# Altium footprint library hand_ad_lib.PcbLib: 105 footprints (part 5 of 7)
Each footprint in its own frame and in the unit in brackets; x right, y up, seen from the top. Pads: shape width x height; smd on the part's side, far side on the other; paste and mask are expansions set on the pad; w line width, h text height; cw(c..) or ccw(c..) is an arc to the next point about the centre after c.
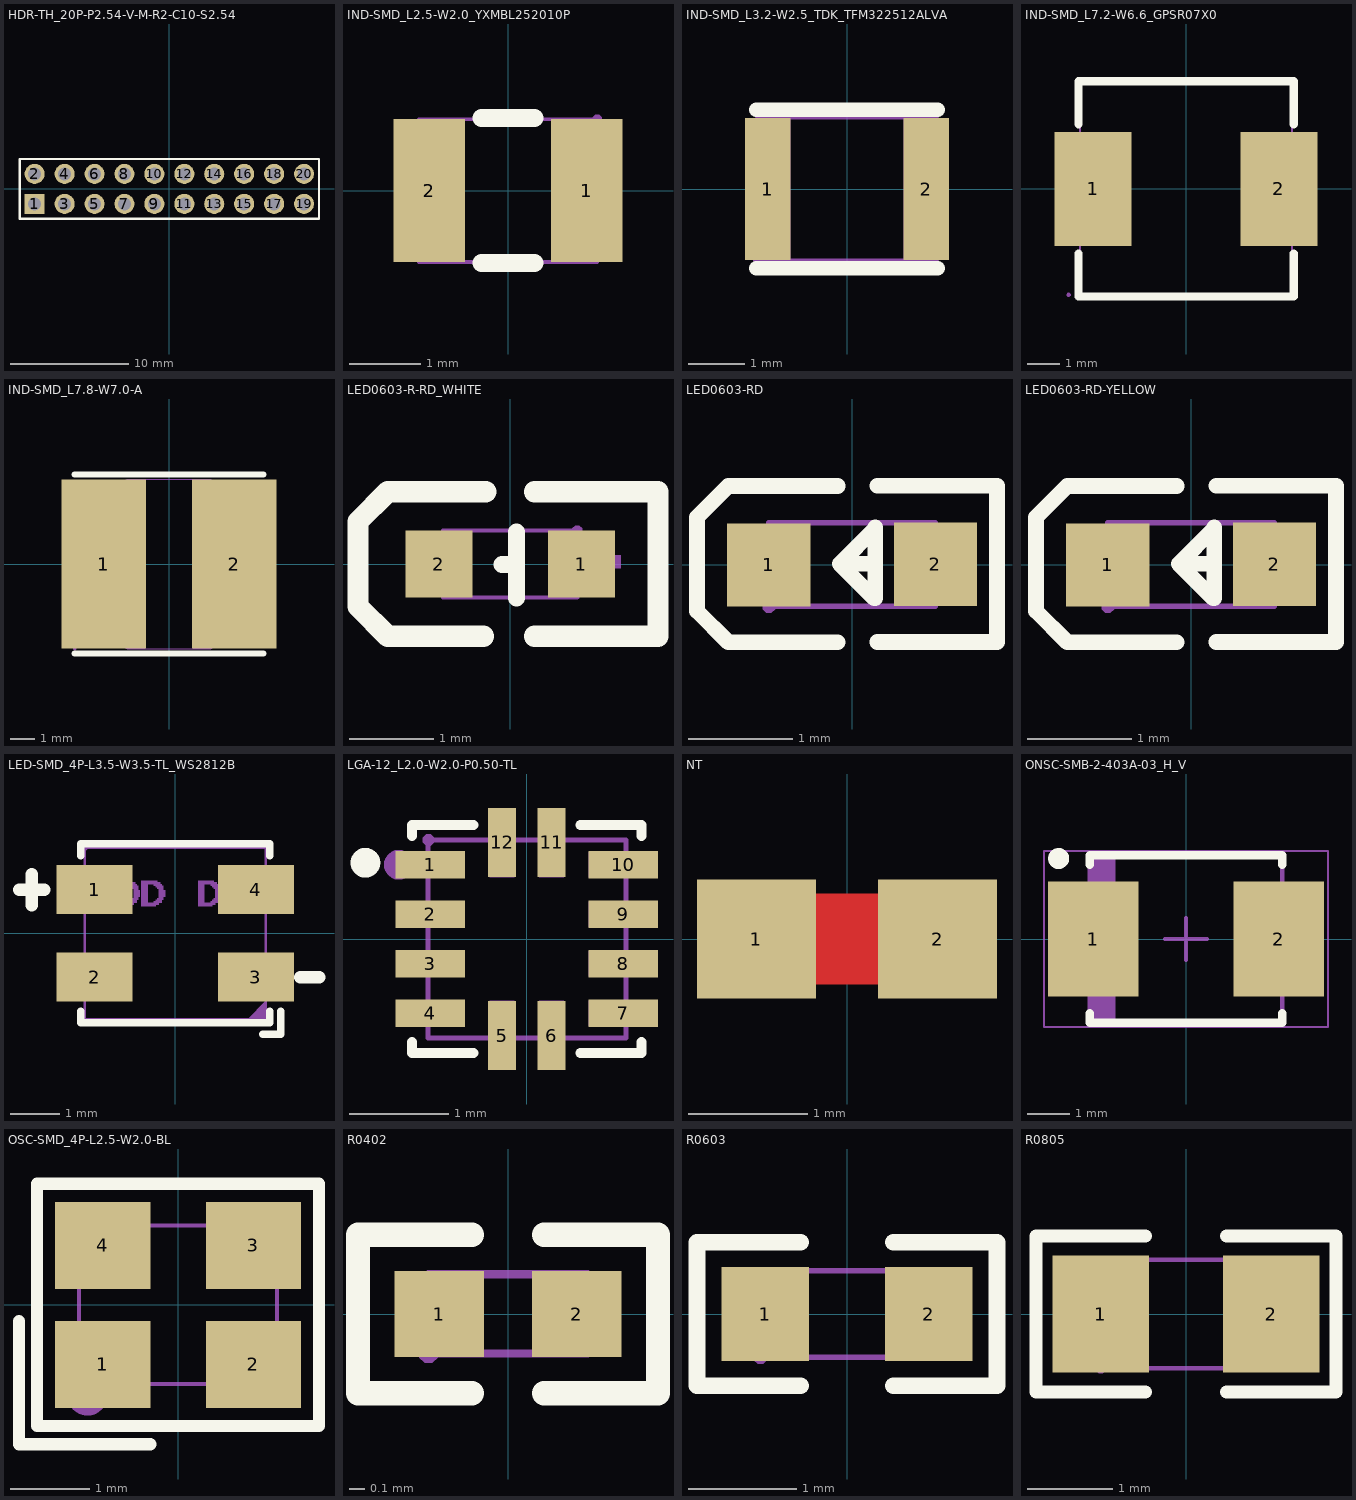
[diagram p4: the footprints below, top view; thin cyan lines are the x and y axes]

## HDR-TH_20P-P2.54-V-M-R2-C10-S2.54 [mm]
pads (20):
  rect 1.7x1.7 hole 1.1: 1(-11.43,-1.27)
  round 1.7 hole 1.1: 2(-11.43,1.27) 3(-8.89,-1.27) 4(-8.89,1.27) 5(-6.35,-1.27) 6(-6.35,1.27) 7(-3.81,-1.27) 8(-3.81,1.27) 9(-1.27,-1.27) 10(-1.27,1.27) 11(1.27,-1.27) 12(1.27,1.27) 13(3.81,-1.27) 14(3.81,1.27) 15(6.35,-1.27) 16(6.35,1.27) 17(8.89,-1.27) 18(8.89,1.27) 19(11.43,-1.27) 20(11.43,1.27)
Top Overlay:
  lines w0.203: -12.7,-2.54 -10.795,-2.54 12.7,-2.54 12.7,2.54 -10.795,2.54 -12.7,2.54 -12.7,-2.54
Mechanical 15:
  region: -12.64,-2.5 -12.64,-2.475 -12.675,-2.44 -12.725,-2.44 -12.76,-2.475 -12.76,-2.5 -12.76,-2.525 -12.725,-2.56 -12.675,-2.56 -12.64,-2.525
  region: -11.75,-0.95 -11.11,-0.95 -11.11,-1.59 -11.75,-1.59
  region: -11.75,1.59 -11.11,1.59 -11.11,0.95 -11.75,0.95
  region: -9.21,-0.95 -8.57,-0.95 -8.57,-1.59 -9.21,-1.59
  region: -9.21,1.59 -8.57,1.59 -8.57,0.95 -9.21,0.95
  region: -6.67,-0.95 -6.03,-0.95 -6.03,-1.59 -6.67,-1.59
  region: -6.67,1.59 -6.03,1.59 -6.03,0.95 -6.67,0.95
  region: -4.13,-0.95 -3.49,-0.95 -3.49,-1.59 -4.13,-1.59
  region: -4.13,1.59 -3.49,1.59 -3.49,0.95 -4.13,0.95
  region: -1.59,-0.95 -0.95,-0.95 -0.95,-1.59 -1.59,-1.59
  region: -1.59,1.59 -0.95,1.59 -0.95,0.95 -1.59,0.95
  region: 0.95,-0.95 1.59,-0.95 1.59,-1.59 0.95,-1.59
  region: 0.95,1.59 1.59,1.59 1.59,0.95 0.95,0.95
  region: 3.49,-0.95 4.13,-0.95 4.13,-1.59 3.49,-1.59
  region: 3.49,1.59 4.13,1.59 4.13,0.95 3.49,0.95
  region: 6.03,-0.95 6.67,-0.95 6.67,-1.59 6.03,-1.59
  region: 6.03,1.59 6.67,1.59 6.67,0.95 6.03,0.95
  region: 8.57,-0.95 9.21,-0.95 9.21,-1.59 8.57,-1.59
  region: 8.57,1.59 9.21,1.59 9.21,0.95 8.57,0.95
  region: 11.11,-0.95 11.75,-0.95 11.75,-1.59 11.11,-1.59
  region: 11.11,1.59 11.75,1.59 11.75,0.95 11.11,0.95
  lines w0.051: -12.7,-2.5 -12.7,2.5 12.7,2.5 12.7,-2.5 -12.7,-2.5
3D body "PH2.54-2x10.x_t": height 8.49, standoff -3.01, extent -12.7,-2.54 12.701,2.54

## IND-SMD_L2.5-W2.0_YXMBL252010P [mm]
pads (2):
  rect 1x2 smd: 1(1.1,0) 2(-1.1,0)
Top Overlay:
  lines w0.254: -0.369,-1.016 0.369,-1.016 ; -0.369,1.016 0.369,1.016
Mechanical 15:
  region: -1.25,0.9 -0.65,0.9 -0.65,-0.9 -1.25,-0.9
  region: 0.65,0.9 1.25,0.9 1.25,-0.9 0.65,-0.9
  region: 1.31,1 1.31,1.025 1.275,1.06 1.225,1.06 1.19,1.025 1.19,1 1.19,0.975 1.225,0.94 1.275,0.94 1.31,0.975
  lines w0.051: -1.25,-1 -1.25,1 1.25,1 1.25,-1 -1.25,-1
3D body "SLO252010FR47MTT.x_t": height 1.01, standoff 0, extent -1.26,-1.01 1.26,1

## IND-SMD_L3.2-W2.5_TDK_TFM322512ALVA [mm]
pads (2):
  rect 0.8x2.5 smd paste+0 mask+0.05: 1(-1.4,0) 2(1.4,0)
Top Overlay:
  lines w0.254: -1.6,-1.4 1.6,-1.4 ; -1.6,1.4 1.6,1.4
Mechanical 15:
  region: -1.54,-1.25 -1.54,-1.225 -1.575,-1.19 -1.625,-1.19 -1.66,-1.225 -1.66,-1.25 -1.66,-1.275 -1.625,-1.31 -1.575,-1.31 -1.54,-1.275
  region: 1.6,1.25 1.6,-1.25 1,-1.25 1,1.25
  region: -1,1.25 -1,-1.25 -1.6,-1.25 -1.6,1.25
  lines w0.051: -1.6,-1.25 -1.6,1.25 1.6,1.25 1.6,-1.25 -1.6,-1.25
3D body "TFM322512ALMA1R0MTAA.stp": height 1.2, standoff 0, extent -1.6,-1.25 1.6,1.25

## IND-SMD_L7.2-W6.6_GPSR07X0 [mm]
pads (2):
  rect 2.35x3.5 smd: 1(-2.85,0) 2(2.85,0)
Top Overlay:
  lines w0.254: -3.3,-1.981 -3.3,-3.3 3.3,-3.3 3.3,-1.981 ; -3.3,1.981 -3.3,3.3 3.3,3.3 3.3,1.981
Mechanical 15:
  region: -1.9,-1.5 -3.6,-1.5 -3.6,1.5 -1.9,1.5
  region: 1.9,1.5 3.6,1.5 3.6,-1.5 1.9,-1.5
  region: -3.54,-3.25 -3.541,-3.226 -3.576,-3.192 -3.624,-3.192 -3.659,-3.226 -3.66,-3.25 -3.659,-3.274 -3.624,-3.308 -3.576,-3.308 -3.541,-3.274
  lines w0.051: -3.25,-3.25 -3.25,3.25 3.25,3.25 3.25,-3.25 -3.25,-3.25
3D body "CYA0630-10UH.x_t": height 2.8, standoff 0, extent -3.525,-3.3 3.525,3.3

## IND-SMD_L7.8-W7.0-A [mm]
pads (2):
  rect 3.5x7 smd: 1(-2.7,0) 2(2.7,0)
Top Overlay:
  lines w0.254: -3.9,-3.7 3.9,-3.7 ; -3.9,3.7 3.9,3.7
Mechanical 15:
  region: 1,-3.5 1,3.5 1.72,3.5 2.1,3.29 2.49,3.015 2.795,2.725 3.11,2.35 3.415,1.87 3.73,1.185 3.865,0.305 3.885,-0.31 3.805,-0.805 3.63,-1.455 3.3,-2.08 2.84,-2.635 2.525,-3.01 1.995,-3.345 1.72,-3.5
  region: -1,3.5 -1,-3.5 -1.72,-3.5 -2.1,-3.29 -2.49,-3.015 -2.795,-2.725 -3.11,-2.35 -3.415,-1.87 -3.73,-1.185 -3.865,-0.305 -3.885,0.31 -3.805,0.805 -3.63,1.455 -3.3,2.08 -2.84,2.635 -2.525,3.01 -1.995,3.345 -1.72,3.5
  region: -3.84,-3.5 -3.841,-3.476 -3.876,-3.442 -3.924,-3.442 -3.959,-3.476 -3.96,-3.5 -3.959,-3.524 -3.924,-3.558 -3.876,-3.558 -3.841,-3.524
  lines w0.051: -3.885,0.31 -3.865,-0.305 -3.73,-1.185 -3.415,-1.87 -3.11,-2.35 -2.795,-2.725 -2.49,-3.015 -2.27,-3.17 -2.1,-3.29 -1.72,-3.5 -1.715,-3.5 -1.36,-3.5 -0.1,-3.5 0.1,-3.5 1.72,-3.5 1.995,-3.345 2.525,-3.01 2.84,-2.635 3.3,-2.08 3.63,-1.455 3.805,-0.805 3.885,-0.31 3.865,0.305 3.73,1.185 3.415,1.87 3.11,2.35 2.795,2.725 2.49,3.015 2.27,3.17 2.1,3.29 1.72,3.5 1.715,3.5 1.36,3.5 0.1,3.5 -0.1,3.5 -1.72,3.5 -1.995,3.345 -2.525,3.01 -2.84,2.635 -3.3,2.08 -3.63,1.455 -3.805,0.805 -3.885,0.31
3D body "CD75T125NP-100KC.x_t": height 5, standoff 0, extent -3.89,-3.501 3.89,3.51

## LED0603-R-RD_WHITE [mm]
pads (2):
  rect 0.8x0.8 smd: 1(0.851,0) 2(-0.851,0)
Top Overlay:
  lines w0.203: -0.099,-0.008 0.076,-0.008 ; 0.076,-0.406 0.076,0.381
  lines w0.254: -0.318,-0.864 -1.46,-0.864 -1.816,-0.508 -1.816,0.508 -1.46,0.864 -0.292,0.864 ; 0.292,-0.864 1.765,-0.864 1.765,0.864 0.292,0.864
Mechanical 6:
  region: -1.193,0.05 -0.533,0.05 -0.533,-0.103 -1.193,-0.103
  region: 0.936,-0.275 0.936,0.385 1.088,0.385 1.088,-0.275
  region: 0.66,0.102 1.321,0.102 1.321,-0.051 0.66,-0.051
Mechanical 15:
  region: 0.86,0.4 0.86,0.425 0.825,0.459 0.776,0.459 0.741,0.425 0.74,0.4 0.741,0.376 0.776,0.341 0.825,0.341 0.86,0.376
  region: -0.8,-0.4 -0.8,0.4 -0.5,0.4 -0.5,-0.4
  region: 0.8,0.4 0.8,-0.4 0.5,-0.4 0.5,0.4
  lines w0.051: -0.8,-0.4 0.8,-0.4 0.8,0.4 -0.8,0.4 -0.8,-0.4
3D body "KT-0603W.x_t": height 0.81, standoff 0, extent -0.81,-0.406 0.81,0.404

## LED0603-RD [mm]
pads (2):
  rect 0.8x0.8 smd: 1(-0.799,-0.003) 2(0.799,0.003)
Top Overlay:
  lines w0.15: -0.14,-0.746 -1.19,-0.746 -1.49,-0.446 -1.49,-0.346 -1.49,0.354 -1.49,0.454 -1.19,0.754 -0.14,0.754 ; 0.22,0.007 -0.12,0.007 ; 0.24,-0.744 1.39,-0.744 ; 0.24,0.757 1.39,0.757 1.39,-0.723 ; -0.12,0.007 0.22,0.347 0.22,0.357 0.22,-0.324 0.21,-0.324 -0.12,0.007
Mechanical 6:
  region: 0.529,0.068 1.069,0.068 1.069,-0.062 0.529,-0.062
  region: 0.735,-0.267 0.735,0.273 0.865,0.273 0.865,-0.267
  region: -1.07,0.062 -0.53,0.062 -0.53,-0.068 -1.07,-0.068
Mechanical 15:
  region: 0.5,-0.396 0.5,0.404 0.8,0.404 0.8,-0.396
  region: -0.8,-0.403 -0.8,0.397 -0.5,0.397 -0.5,-0.403
  region: -0.739,-0.403 -0.739,-0.379 -0.775,-0.344 -0.824,-0.343 -0.859,-0.379 -0.859,-0.403 -0.859,-0.428 -0.824,-0.463 -0.775,-0.463 -0.74,-0.428
  lines w0.051: -0.8,-0.4 0.8,-0.4 0.8,0.4 -0.8,0.4 -0.8,-0.4
3D body "KT-0603R.x_t": height 0.56, standoff 0, extent -0.81,-0.41 0.81,0.41

## LED0603-RD-YELLOW [mm]
pads (2):
  rect 0.8x0.8 smd: 1(-0.799,-0.003) 2(0.799,0.003)
Top Overlay:
  lines w0.15: -0.14,-0.746 -1.19,-0.746 -1.49,-0.446 -1.49,-0.346 -1.49,0.354 -1.49,0.454 -1.19,0.754 -0.14,0.754 ; 0.22,0.007 -0.12,0.007 ; 0.24,-0.744 1.39,-0.744 ; 0.24,0.757 1.39,0.757 1.39,-0.723 ; -0.12,0.007 0.21,-0.323 0.22,-0.323 0.22,0.357 0.22,0.347 -0.12,0.007
Mechanical 6:
  region: 0.529,0.068 1.069,0.068 1.069,-0.062 0.529,-0.062
  region: 0.735,-0.267 0.735,0.273 0.865,0.273 0.865,-0.267
  region: -1.07,0.062 -0.53,0.062 -0.53,-0.068 -1.07,-0.068
Mechanical 15:
  region: -0.739,-0.403 -0.739,-0.379 -0.775,-0.343 -0.824,-0.343 -0.859,-0.379 -0.859,-0.403 -0.859,-0.428 -0.824,-0.463 -0.775,-0.463 -0.74,-0.428
  region: 0.5,-0.396 0.5,0.404 0.8,0.404 0.8,-0.396
  region: -0.8,-0.403 -0.8,0.397 -0.5,0.397 -0.5,-0.403
  lines w0.051: -0.8,-0.4 -0.8,0.4 0.8,0.4 0.8,-0.4 -0.8,-0.4
3D body "19-213Y2C-CQ2R2L3T.x_t": height 0.56, standoff 0, extent -0.81,-0.407 0.81,0.413

## LED-SMD_4P-L3.5-W3.5-TL_WS2812B [mm]
pads (4):
  rect 1.545x0.997 smd: 1(-1.638,0.89) 2(-1.638,-0.89) 3(1.638,-0.89) 4(1.638,0.89)
Top Overlay:
  lines w0.152: -1.916,-1.579 -1.916,-1.816 1.916,-1.816 1.916,-1.579 ; -1.916,1.579 -1.916,1.816 1.916,1.816 1.916,1.579 ; 1.777,-2.045 2.145,-2.045 2.145,-1.579
  lines w0.254: -3.175,0.889 -2.667,0.889 ; -2.921,0.572 -2.921,1.206 ; 2.54,-0.889 2.921,-0.889
Mechanical 6:
  drawing of 102 lines, arcs and shapes, not listed
Mechanical 15:
  region: -1.84,1.29 -0.89,1.29 -0.89,0.49 -1.84,0.49
  region: -1.84,-0.49 -0.89,-0.49 -0.89,-1.29 -1.84,-1.29
  region: 1.84,-0.49 0.89,-0.49 0.89,-1.29 1.84,-1.29
  region: 1.84,1.29 0.89,1.29 0.89,0.49 1.84,0.49
  region: -1.78,1.74 -1.781,1.764 -1.816,1.799 -1.864,1.799 -1.899,1.764 -1.9,1.74 -1.899,1.715 -1.864,1.681 -1.815,1.681 -1.78,1.715
  lines w0.051: -1.84,-1.74 1.84,-1.74 1.84,1.74 -1.84,1.74 -1.84,-1.74
3D body "WS2812B-MINI-V3-W.x_t": height 2.06, standoff 0, extent -1.85,-1.85 1.85,1.861

## LGA-12_L2.0-W2.0-P0.50-TL [mm]
pads (12):
  rect 0.7x0.28 smd: 1(-0.975,0.75) 2(-0.975,0.25) 3(-0.975,-0.25) 4(-0.975,-0.75) 7(0.975,-0.75) 8(0.975,-0.25) 9(0.975,0.25) 10(0.975,0.75)
  rect 0.28x0.7 smd: 5(-0.25,-0.975) 6(0.25,-0.975) 11(0.25,0.975) 12(-0.25,0.975)
Top Overlay:
  circle w0.15: c-1.63,0.77 r0.075
  lines w0.1: -1.16,-1.04 -1.16,-1.15 -0.54,-1.15 ; -1.16,1.04 -1.16,1.15 -0.54,1.15 ; 0.54,-1.15 1.16,-1.15 1.16,-1.04 ; 0.54,1.15 1.16,1.15 1.16,1.04
Mechanical 6:
  circle w0.15: c-1.292,0.75 r0.075
Mechanical 15:
  region: -0.375,0.625 -0.375,0.9 -0.125,0.9 -0.125,0.625
  region: 0.125,0.625 0.125,0.9 0.375,0.9 0.375,0.625
  region: 0.125,-0.9 0.125,-0.625 0.375,-0.625 0.375,-0.9
  region: -0.375,-0.9 -0.375,-0.625 -0.125,-0.625 -0.125,-0.9
  region: 0.9,0.875 0.9,0.625 0.625,0.625 0.625,0.875
  region: 0.625,0.125 0.625,0.375 0.9,0.375 0.9,0.125
  region: 0.625,-0.375 0.625,-0.125 0.9,-0.125 0.9,-0.375
  region: 0.9,-0.625 0.9,-0.875 0.625,-0.875 0.625,-0.625
  region: -0.625,-0.625 -0.625,-0.875 -0.9,-0.875 -0.9,-0.625
  region: -0.9,-0.375 -0.9,-0.125 -0.625,-0.125 -0.625,-0.375
  region: -0.9,0.125 -0.9,0.375 -0.625,0.375 -0.625,0.125
  region: -0.625,0.875 -0.625,0.625 -0.9,0.625 -0.9,0.875
  region: -0.933,1 -0.933,1.024 -0.968,1.059 -1.017,1.059 -1.052,1.024 -1.052,1 -1.052,0.975 -1.017,0.941 -0.968,0.941 -0.933,0.975
  lines w0.051: -1,-1 -1,1 1,1 1,-1 -1,-1
3D body "KX132-1211_KNX.step": height 0.99, standoff 0, extent -1.003,-1.003 1.003,1.003

## NT [mm] "Net Tie SMD"
pads (2):
  rect 1x1 smd paste-100 mask-100: 1(-0.762,0) 2(0.762,0)
Top Layer:
  rectangle: -0.381,-0.381 0.381,0.381

## ONSC-SMB-2-403A-03_H_V [mm] "Molded, 2-Leads, Body 4.6x3.95mm"
height 2.42
pads (2):
  rect 2.159x2.743 smd: 1(-2.21,0) 2(2.21,0)
Top Overlay:
  circle w0.25: c-3.04,1.921 r0.125
  lines w0.2: -2.3,-1.772 -2.3,-2 2.3,-2 2.3,-1.772 ; -2.3,1.772 -2.3,2 2.3,2 2.3,1.772
Mechanical 13:
  rectangle: -2.3,-1.975 -1.681,1.975
  lines w0.1: -2.3,-1.975 2.3,-1.975 2.3,1.975 -2.3,1.975 -2.3,-1.975
Mechanical 15:
  lines w0.05: -3.39,-2.1 3.39,-2.1 3.39,2.1 -3.39,2.1 -3.39,-2.1
  lines w0.1: -0.5,0 0.5,0 ; 0,-0.5 0,0.5
3D body: height 2.42, standoff 0, extent -2.3,-1.975 2.3,1.975

## OSC-SMD_4P-L2.5-W2.0-BL [mm]
pads (4):
  rect 1.2x1.1 smd: 1(-0.95,-0.75) 2(0.95,-0.75) 3(0.95,0.75) 4(-0.95,0.75)
Top Overlay:
  lines w0.152: -2.007,-0.201 -2.007,-1.758 -0.351,-1.758 ; -1.779,-1.529 -1.779,1.529 1.779,1.529 1.779,-1.529 -1.779,-1.529
Mechanical 6:
  circle w0.254: c-1.143,-1.143 r0.127
  region: -1.143,0.635 -0.635,0.635 -0.635,0.508 -1.143,0.508
  region: -0.953,0.318 -0.953,0.826 -0.826,0.826 -0.826,0.318
  region: 0.635,-0.635 1.143,-0.635 1.143,-0.762 0.635,-0.762
Mechanical 15:
  region: -1.19,-1 -1.19,-0.976 -1.225,-0.941 -1.274,-0.941 -1.309,-0.976 -1.31,-1 -1.309,-1.024 -1.274,-1.059 -1.225,-1.059 -1.19,-1.024
  region: -1.25,1 -0.45,1 -0.45,0.325 -1.25,0.325
  region: -0.45,-1 -1.25,-1 -1.25,-0.325 -0.45,-0.325
  region: 1.25,0.325 0.45,0.325 0.45,1 1.25,1
  region: 1.25,-1 0.45,-1 0.45,-0.325 1.25,-0.325
  lines w0.051: -1.25,-1 -1.25,1 1.25,1 1.25,-1 -1.25,-1
3D body "OK252032.768KJBA4SL.x_t": height 0.57, standoff 0, extent -1.25,-1 1.25,1

## R0402 [mm]
pads (2):
  rect 0.566x0.54 smd paste-100 mask+0.051: 1(-0.433,0) 2(0.433,0)
Top Overlay:
  lines w0.152: -0.226,-0.499 -0.944,-0.499 -0.944,0.499 -0.226,0.499 ; 0.226,-0.499 0.944,-0.499 0.944,0.499 0.226,0.499
Top Paste:
  region: 0.135,-0.23 0.135,0.23 0.175,0.27 0.676,0.27 0.716,0.23 0.716,-0.23 0.676,-0.27 0.175,-0.27
  region: -0.135,-0.23 -0.135,0.23 -0.175,0.27 -0.676,0.27 -0.716,0.23 -0.716,-0.23 -0.676,-0.27 -0.175,-0.27
Mechanical 15:
  region: 0.251,-0.25 0.251,0.25 0.501,0.25 0.501,-0.25
  region: -0.249,0.25 -0.249,-0.25 -0.499,-0.25 -0.499,0.25
  region: -0.44,-0.25 -0.441,-0.226 -0.476,-0.192 -0.524,-0.192 -0.559,-0.226 -0.56,-0.25 -0.559,-0.274 -0.524,-0.308 -0.476,-0.308 -0.441,-0.274
  lines w0.051: -0.5,-0.25 -0.5,0.25 0.5,0.25 0.5,-0.25 -0.5,-0.25
3D body "0402WGF5101TCE.x_t": height 0.5, standoff 0, extent -0.5,-0.246 0.5,0.254

## R0603 [mm]
pads (2):
  rect 0.806x0.864 smd paste-100 mask+0.051: 1(-0.753,0) 2(0.753,0)
Top Overlay:
  lines w0.152: -0.426,-0.661 -1.385,-0.661 -1.385,0.661 -0.426,0.661 ; 0.426,-0.661 1.385,-0.661 1.385,0.661 0.426,0.661
Top Paste:
  region: 1.195,0.45 0.395,0.45 0.345,0.4 0.345,0.172 0.715,0.172 0.715,-0.158 0.345,-0.158 0.345,-0.4 0.395,-0.45 1.195,-0.45 1.245,-0.4 1.245,0.4
  region: -0.355,0.4 -0.355,0.172 -0.735,0.172 -0.735,-0.158 -0.355,-0.158 -0.355,-0.4 -0.405,-0.45 -1.195,-0.45 -1.245,-0.4 -1.245,0.4 -1.195,0.45 -0.405,0.45
Mechanical 15:
  region: -0.74,-0.4 -0.74,-0.375 -0.775,-0.34 -0.825,-0.34 -0.86,-0.375 -0.86,-0.4 -0.86,-0.425 -0.825,-0.46 -0.775,-0.46 -0.74,-0.425
  region: 0.8,-0.4 0.8,0.4 0.5,0.4 0.5,-0.4
  region: -0.8,-0.4 -0.8,0.4 -0.5,0.4 -0.5,-0.4
  lines w0.051: -0.8,-0.4 0.8,-0.4 0.8,0.4 -0.8,0.4 -0.8,-0.4
3D body "0603WAF1201T5E.x_t": height 0.45, standoff 0, extent -0.81,-0.405 0.81,0.405

## R0805 [mm]
pads (2):
  rect 1.133x1.377 smd paste-100 mask+0.051: 1(-1,0) 2(1,0)
Top Overlay:
  lines w0.152: -0.476,-0.917 -1.761,-0.917 -1.761,0.917 -0.476,0.917 ; 0.476,-0.917 1.761,-0.917 1.761,0.917 0.476,0.917
Top Paste:
  region: -1.7,-0.64 -1.7,0.64 -1.65,0.69 -0.5,0.69 -0.45,0.64 -0.445,0.23 -0.895,0.23 -0.895,-0.22 -0.455,-0.22 -0.45,-0.64 -0.5,-0.69 -1.65,-0.69
  region: 0.45,-0.64 0.45,-0.22 0.895,-0.22 0.895,0.23 0.455,0.23 0.45,0.64 0.5,0.69 1.65,0.69 1.7,0.64 1.7,-0.64 1.65,-0.69 0.5,-0.69
Mechanical 15:
  region: -1,-0.637 -1,0.637 -0.6,0.637 -0.6,-0.637
  region: 1,-0.637 1,0.637 0.6,0.637 0.6,-0.637
  region: -0.94,-0.638 -0.941,-0.614 -0.976,-0.58 -1.024,-0.58 -1.059,-0.613 -1.06,-0.637 -1.059,-0.661 -1.024,-0.695 -0.976,-0.695 -0.941,-0.662
  lines w0.051: -1,-0.637 -1,0.637 1,0.637 1,-0.637 -1,-0.637
3D body "R0805.x_t": height 0.61, standoff 0, extent -1,-0.651 1,0.65